# Altium schematic symbol library LATTICEPLDS_Library.SchLib: 291 symbols (part 27 of 32)
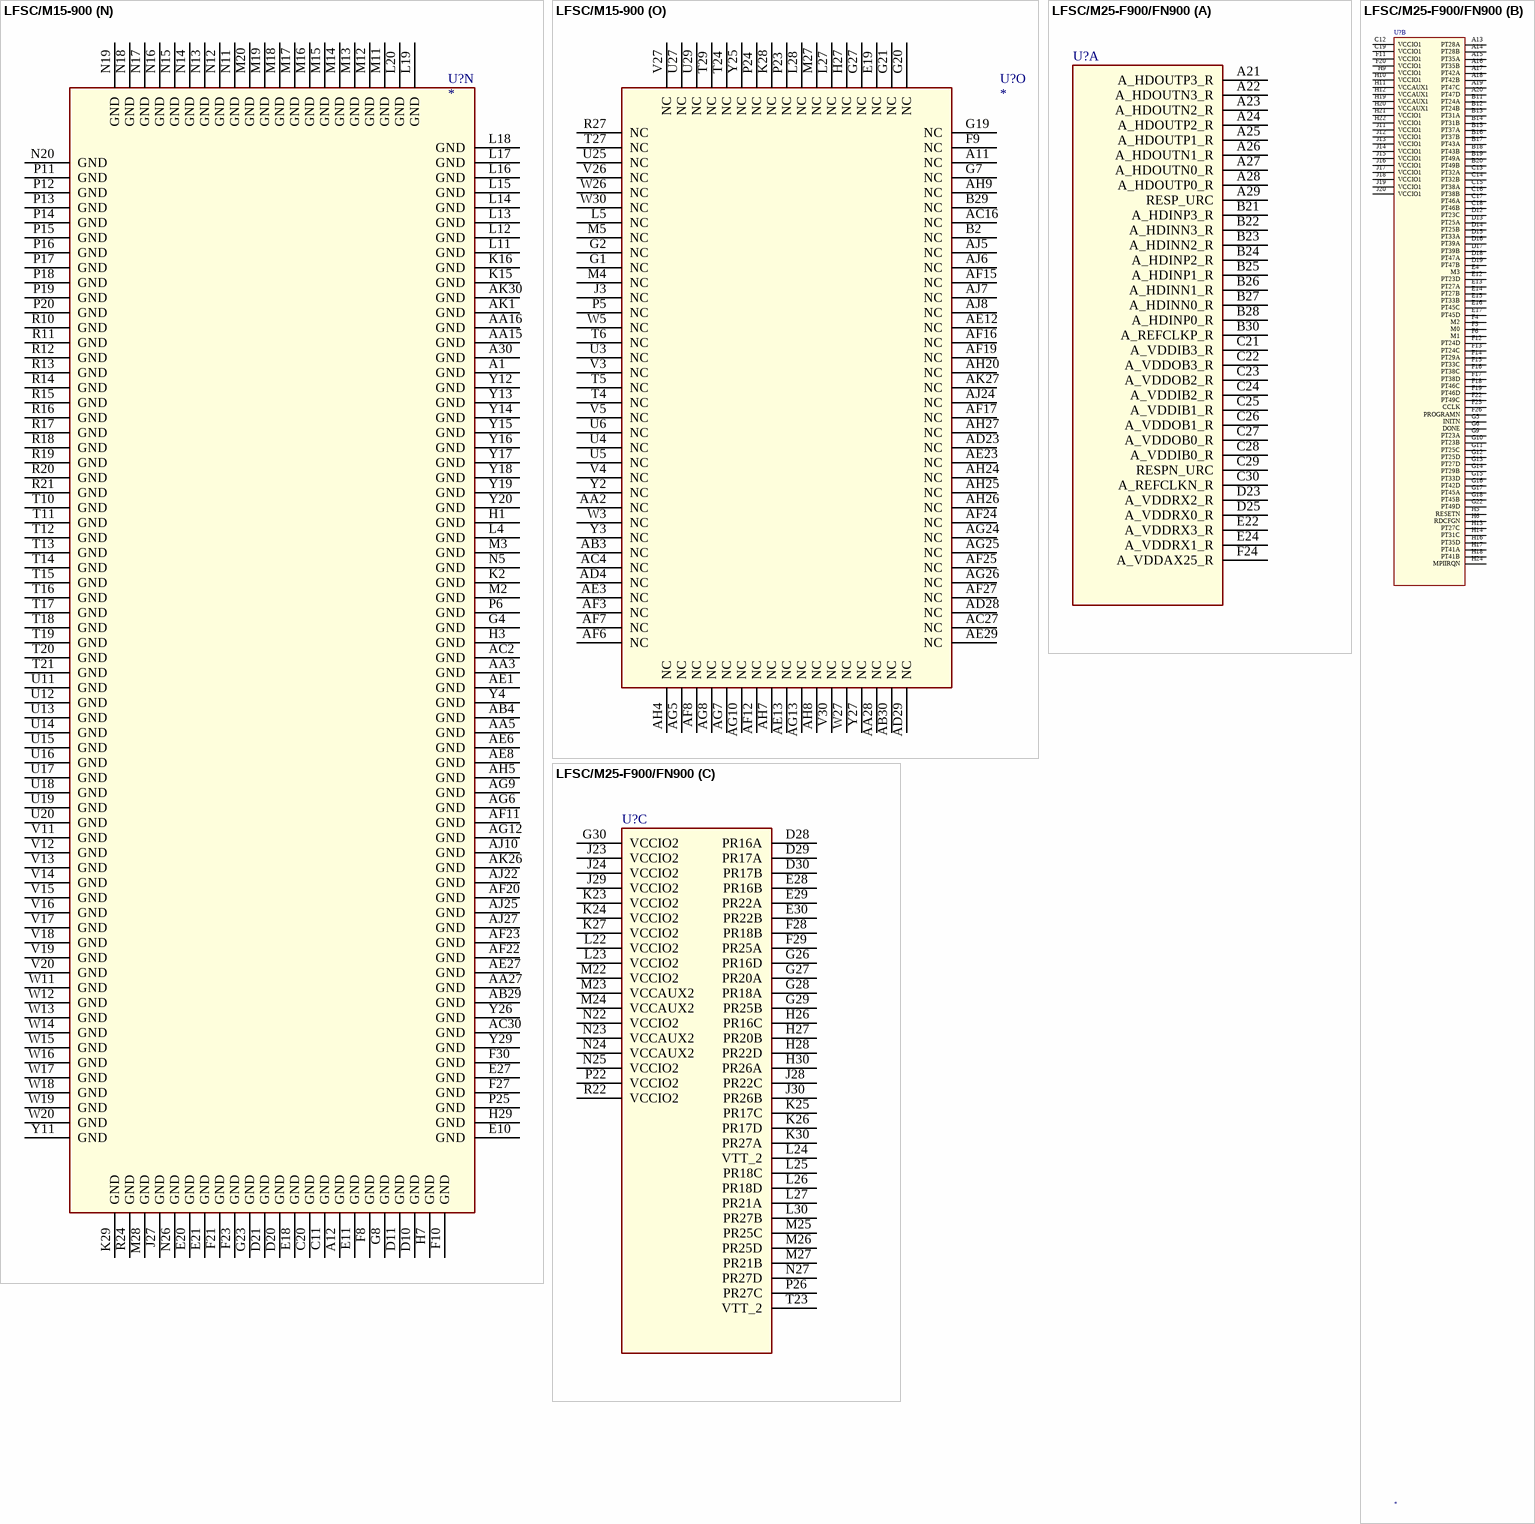
[diagram p329: symbols LFSC/M15-900 to LFSC/M25-F900/FN900]

## LFSC/M15-900
designator U?
SWAP_INFO: (S1+S2+S3+S4+S5+S6+S7+S8+S9+S10+S11+S12+S13+S14+S15); SPLIT_INST: TRUE
part A pins: A3 A_HDOUTP0_L /PCS 360 CH 0 OUT P (out), A4 A_HDOUTN0_L /PCS 360 CH 0 OUT N (out), A5 A_HDOUTN1_L /PCS 360 CH 1 OUT N (out), A6 A_HDOUTP1_L /PCS 360 CH 1 OUT (out), A7 A_HDOUTP2_L /PCS 360 CH 2 OUT P (out), A8 A_HDOUTN2_L /PCS 360 CH 2 OUT N (out), A9 A_HDOUTN3_L /PCS 360 CH 3 OUT N (out), A10 A_HDOUTP3_L /PCS 360 CH 3 OUT (out), A21 A_HDOUTP3_R /PCS 3E0 CH 3 OUT P (out), A22 A_HDOUTN3_R /PCS 3E0 CH 3 OUT N (out), A23 A_HDOUTN2_R /PCS 3E0 CH 2 OUT N (out), A24 A_HDOUTP2_R /PCS 3E0 CH 2 OUT P (out), A25 A_HDOUTP1_R /PCS 3E0 CH 1 OUT P (out), A26 A_HDOUTN1_R /PCS 3E0 CH 1 OUT N (out), A27 A_HDOUTN0_R /PCS 3E0 CH 0 OUT (out), A28 A_HDOUTP0_R /PCS 3E0 CH 0 OUT P (out), B1 A_REFCLKP_L (in), B3 A_HDINP0_L /PCS 360 CH 0 IN P (in), B4 A_HDINN0_L /PCS 360 CH 0 IN N (in), B5 A_HDINN1_L /PCS 360 CH 1 IN N (in), B6 A_HDINP1_L /PCS 360 CH 1 IN P (in), B7 A_HDINP2_L /PCS 360 CH 2 IN P (in), B8 A_HDINN2_L /PCS 360 CH 2 IN N (in), B9 A_HDINN3_L /PCS 360 CH 3 IN N (in), B10 A_HDINP3_L /PCS 360 CH 3 IN P (in), B21 A_HDINP3_R /PCS 3E0 CH 3 IN P (in), B22 A_HDINN3_R /PCS 3E0 CH 3 IN N (in), B23 A_HDINN2_R /PCS 3E0 CH 2 IN N (in), B24 A_HDINP2_R /PCS 3E0 CH 2 IN P (in), B25 A_HDINP1_R /PCS 3E0 CH 1 IN P (in), B26 A_HDINN1_R /PCS 3E0 CH 1 IN N (in), B27 A_HDINN0_R /PCS 3E0 CH 0 IN N (in), B28 A_HDINP0_R /PCS 3E0 CH 0 IN P (in), B30 A_REFCLKP_R (in), C1 A_REFCLKN_L (in), C30 A_REFCLKN_R (in)
part B pins: C3 A_VDDIB0_L (power), C4 A_VDDOB0_L (power), C5 A_VDDOB1_L (power), C6 A_VDDIB1_L (power), C7 A_VDDIB2_L (power), C8 A_VDDOB2_L (power), C9 A_VDDOB3_L (power), C10 A_VDDIB3_L (power), C21 A_VDDIB3_R (power), C22 A_VDDOB3_R (power), C23 A_VDDOB2_R (power), C24 A_VDDIB2_R (power), C25 A_VDDIB1_R (power), C26 A_VDDOB1_R (power), C27 A_VDDOB0_R (power), C28 A_VDDIB0_R (power), F7 A_VDDAX25_L (power), F24 A_VDDAX25_R (power)
part C pins: A13 PT19A /A12/MPI_ADDR26 (io), A14 PT19B /A11/MPI_ADDR25 (io), A15 PT25A /A0/MPI_ADDR14 (io), A16 PT25B /MPI_RETRY (io), A17 PT32A /MCA_DONE_IN (io), A18 PT32B /DOUT (io), A19 PT40C /D10/MPI_DATA10 (io), A20 PT40D /D9/MPI_DATA9 (io), B11 PT11A /MPI_TEA (io), B12 PT11B /A18/MPI_TSIZ0 (io), B13 PT21A /A8/MPI_ADDR22 (io), B14 PT21B /A7/MPI_ADDR21 (io), B15 PT27A /PCLKT1_0/MPI_CLK (io), B16 PT27B /PCLKC1_0 (io), B17 PT33A /QOUT/CEON (io), B18 PT33B /D0/MPI_DATA0 (io), B19 PT41A /CS1/MPI_CS1 (io), B20 PT41B /D8/MPI_DATA8 (io), C13 PT23A /A6/MPI_ADDR20 (io), C14 PT23B /A5/MPI_ADDR19 (io), C15 PT28A /MPI_TA (io), C16 PT28B /DP0/MPI_PAR0 (io), C17 PT37A /D5/MPI_DATA5 (io), C18 PT37B /D6/MPI_DATA6 (io), D12 PT10C /DP1/MPI_PAR1 (io), D13 PT15A /A17/MPI_ADDR31 (io), D14 PT15B /A15/MPI_ADDR29 (io), D15 PT24A /A4/MPI_ADDR18 (io), D16 PT29A /MCA_CLK_P2_IN (io), D17 PT29B /MCA_CLK_P2_OUT (io), D18 PT39A /RDN/MPI_STRB_N (io), D19 PT39B /CS0N/MPI_CS0N (io), E12 PT10D /D14/MPI_DATA14 (io), E13 PT17A /A14/MPI_ADDR28 (io), E14 PT17B /A13/MPI_ADDR27 (io), E15 PT24B /A3/MPI_ADDR17 (io), E16 PT36C /D3/MPI_DATA3 (io), E17 PT36D /D4/MPI_DATA4 (io), F12 PT13D /A19/MPI_TSIZ1 (io), F13 PT13C /A20/MPI_BDIP (io), F14 PT20A /A10/MPI_ADDR24 (io), F15 PT24C /A2/MPI_ADDR16 (io), F16 PT28C /BUSYN/RCLK/SCK (io), F17 PT28D /MCA_DONE_OUT (io), F18 PT37C /D7/MPI_DATA7 (io), F19 PT37D /WRN/MPI_WR_N (io), F22 PT43C /LDCN/SCS (io), G9 PT9A /D15/MPI_DATA15 (io), G10 PT9B /A21/MPI_BURST (io), G11 PT15C /D13/MPI_DATA13 (io), G12 PT15D /A16/MPI_ADDR30 (io), G13 PT17D /D11/MPI_DATA11 (io), G14 PT20B /A9/MPI_ADDR23 (io), G15 PT24D /A1/MPI_ADDR15 (io), G16 PT32D /VREF2_1 (io), G17 PT35A /D1/MPI_DATA1 (io), G18 PT35B /D2/MPI_DATA2 (io), G22 PT43D /HDC/SI (io), H13 PT17C /D12/MPI_DATA12 (io), H14 PT21C /VREF1_1 (io), H16 PT25D /DP3/PCLKC1_4/MPI_PAR3 (io), H17 PT31A /MCA_CLK_P1_IN (io), H18 PT31B /MCA_CLK_P1_OUT (io), H24 MPI_IRQ_N /CFGIRQN/MPI_IRQ_ (out)
part D pins: AA25 PR40A (io), AA30 PR39B (io), AB25 PR40B (io), AB26 PR44C /LRC_DLLT_IN_E/LRC_DLLT_FB_F (io), AB27 PR41D /VREF2_3 (io), AB28 PR43A (io), AC25 PR45D /LRC_PLLC_IN_B/LRC_PLLC_FB_A (io), AC26 PR44D /LRC_DLLC_IN_E/LRC_DLLC_FB_F (io), AC28 PR43B (io), AD26 PR45C /LRC_PLLT_IN_B/LRC_PLLT_FB_A (io), AD30 PR41A (io), AE30 PR41B (io), AF28 PR45B /LRC_DLLC_IN_F/LRC_DLLC_FB_E (io), AF29 PR45A /LRC_DLLT_IN_F/LRC_DLLT_FB_E (io), AF30 PR44A (io), AG30 PR44B (io), D28 PR15A /URC_PLLT_IN_A/URC_PLLT_FB_B (io), D29 PR17A /URC_DLLT_IN_C/URC_DLLT_FB_D (io), D30 PR17B /URC_DLLC_IN_C/URC_DLLC_FB_D (io), E28 PR15B /URC_PLLC_IN_A/URC_PLLC_FB_B (io), E29 PR19A (io), E30 PR19B (io), F28 PR18B /URC_DLLC_IN_D/URC_DLLC_FB_C (io), F29 PR22A (io), G26 PR15D (io), G28 PR18A /URC_DLLT_IN_D/URC_DLLT_FB_C (io), G29 PR22B (io), H26 PR15C (io), H28 PR19D (io), H30 PR23A /PCLKT2_1 (io), J28 PR19C (io), J30 PR23B /PCLKC2_1 (io), K25 PR17C /URC_PLLT_IN_B/URC_PLLT_FB_A (io), K26 PR17D /URC_PLLC_IN_B/URC_PLLC_FB_A (io), K30 PR24A /PCLKT2_0 (io), L25 PR18C (io), L26 PR18D /VREF2_2 (io), L29 PR28C /PCLKT3_2 (io), L30 PR24B /PCLKC2_0 (io), M25 PR22C /VREF1_2 (io), M26 PR22D /DIFFR_2 (io), M29 PR32A (io), M30 PR28D /PCLKC3_2 (io), N27 PR24D /PCLKC2_2 (io), N28 PR27A (io), N29 PR27B (io), N30 PR32B (io), P26 PR24C /PCLKT2_2 (io), P27 PR27C /PCLKT3_3 (io), P28 PR26A /PCLKT3_0 (io), P29 PR28A (io), P30 PR33A (io), R25 PR26D /PCLKC3_1 (io), R26 PR26C /PCLKT3_1 (io), R28 PR26B /PCLKC3_0 (io), R29 PR28B (io), R30 PR33B (io), T26 PR31C /VREF1_3 (io), T28 PR31A (io), T30 PR36A (io), U26 PR31D (io), U28 PR31B (io), U30 PR36B (io), V25 PR35D /DIFFR_3 (io), V28 PR35A (io), V29 PR37A (io), W28 PR35B (io), W29 PR37B (io), Y30 PR39A (io)
part E pins: AD25 PB48D (io), AE16 PB28C (io), AE19 PB40C /PCLKT4_4 (io), AE20 PB40D /PCLKC4_4 (io), AE21 PB41A (io), AE22 PB45C (io), AE24 PB47C /VREF1_4 (io), AE25 PB47D (io), AE26 PB48C (io), AF18 PB36A /PCLKT4_1 (io), AF21 PB41B (io), AG16 PB29B (io), AG17 PB32D (io), AG18 PB36B /PCLKC4_1 (io), AG19 PB37C /VREF2_4 (io), AG21 PB43A (io), AG22 PB43B (io), AG28 PB49C /LRC_DLLT_IN_D/LRC_DLLT_FB_C (io), AG29 PB49D /LRC_DLLC_IN_D/LRC_DLLC_FB_C (io), AH16 PB29A (io), AH17 PB32A (io), AH18 PB32B (io), AH19 PB39C (io), AH21 PB44C (io), AH22 PB44A (io), AH23 PB44B (io), AH28 PB47B (io), AH29 PB48B /LRC_DLLC_IN_C/LRC_DLLC_FB_D (io), AH30 PB49B /LRC_PLLC_IN_A/LRC_PLLC_FB_B (io), AJ16 PB28A (io), AJ17 PB28B (io), AJ18 PB33A (io), AJ19 PB33B (io), AJ20 PB37A /PCLKT4_0 (io), AJ21 PB37B /PCLKC4_0 (io), AJ28 PB47A (io), AJ29 PB48A /LRC_DLLT_IN_C/LRC_DLLT_FB_D (io), AJ30 PB49A /LRC_PLLT_IN_A/LRC_PLLT_FB_B (io), AK16 PB27A (io), AK17 PB27B (io), AK18 PB31A (io), AK19 PB31B (io), AK20 PB35A /PCLKT4_2 (io), AK21 PB35B /PCLKC4_2 (io), AK22 PB39A /PCLKT4_5 (io), AK23 PB39B /PCLKC4_5 (io), AK24 PB40A /PCLKT4_3 (io), AK25 PB40B /PCLKC4_3 (io), AK28 PB45A (io), AK29 PB45B (io)
part F pins: AD6 PB4C (io), AD7 PB5C (io), AD8 PB5D /VREF1_5 (io), AD15 PB21C (io), AE5 PB3D /LLC_DLLC_IN_C/LLC_DLLC_FB_D (io), AE10 PB7D (io), AE11 PB9A (io), AE14 PB12D /PCLKC5_4 (io), AE15 PB21D (io), AF4 PB3C /LLC_DLLT_IN_C/LLC_DLLT_FB_D (io), AF9 PB7C (io), AF10 PB9B (io), AF13 PB12C /PCLKT5_4 (io), AF14 PB13C (io), AG3 PB4A /LLC_DLLT_IN_D/LLC_DLLT_FB_C (io), AG14 PB17B /PCLKC5_2 (io), AG15 PB20B (io), AH1 PB3A /LLC_PLLT_IN_A/LLC_PLLT_FB_B (io), AH2 PB4B /LLC_DLLC_IN_D/LLC_DLLC_FB_C (io), AH3 PB7A (io), AH10 PB12A /PCLKT5_3 (io), AH11 PB12B /PCLKC5_3 (io), AH12 PB21A (io), AH13 PB15D /VREF2_5 (io), AH14 PB17A /PCLKT5_2 (io), AH15 PB20A (io), AJ1 PB3B /LLC_PLLC_IN_A/LLC_PLLC_FB_B (io), AJ2 PB5A (io), AJ3 PB7B (io), AJ4 PB8B (io), AJ11 PB15A /PCLKT5_0 (io), AJ12 PB15B /PCLKC5_0 (io), AJ13 PB21B (io), AJ14 PB24A (io), AJ15 PB24B (io), AK2 PB5B (io), AK3 PB8A (io), AK4 PB11A (io), AK5 PB11B (io), AK6 PB13A /PCLKT5_5 (io), AK7 PB13B /PCLKC5_5 (io), AK8 PB16A /PCLKT5_1 (io), AK9 PB16B /PCLKC5_1 (io), AK10 PB19A (io), AK11 PB19B (io), AK12 PB23A (io), AK13 PB23B (io), AK14 PB25A (io), AK15 PB25B (io)
part G pins: AA1 PL37B (io), AB1 PL39A (io), AB5 PL41D /VREF2_6 (io), AB6 PL44C /LLC_DLLT_IN_E/LLC_DLLT_FB_F (io), AC1 PL39B (io), AC3 PL43A (io), AC5 PL44D /LLC_DLLC_IN_E/LLC_DLLC_FB_F (io), AC6 PL45C /LLC_PLLT_IN_B/LLC_PLLT_FB_A (io), AC7 PL45D /LLC_PLLC_IN_B/LLC_PLLC_FB_A (io), AD2 PL41A (io), AD3 PL43B (io), AE2 PL41B (io), AF1 PL44A (io), AF2 PL45A /LLC_DLLT_IN_F/LLC_DLLT_FB_E (io), AG1 PL44B (io), AG2 PL45B /LLC_DLLC_IN_F/LLC_DLLC_FB_E (io), D1 PL19D (io), D2 PL15B /ULC_PLLC_IN_A/ULC_PLLC_FB_B (io), D3 PL15A /ULC_PLLT_IN_A/ULC_PLLT_FB_B (io), E1 PL19C (io), E2 PL17B /ULC_DLLC_IN_C/ULC_DLLC_FB_D (io), E3 PL17A /ULC_DLLT_IN_C/ULC_DLLT_FB_D (io), F1 PL19B (io), F2 PL19A (io), F3 PL18A /ULC_DLLT_IN_D/ULC_DLLT_FB_C (io), G3 PL18B /ULC_DLLC_IN_D/ULC_DLLC_FB_C (io), J1 PL23A /PCLKT7_1 (io), J4 PL17D /ULC_PLLC_IN_B/ULC_PLLC_FB_A (io), J5 PL15D (io), J6 PL15C (io), K1 PL23B /PCLKC7_1 (io), K3 PL22A (io), K4 PL17C /ULC_PLLT_IN_B/ULC_PLLT_FB_A (io), K5 PL18C (io), K6 PL18D /VREF2_7 (io), L1 PL24A /PCLKT7_0 (io), L3 PL22B (io), L6 PL22C /VREF1_7 (io), M1 PL24B /PCLKC7_0 (io), M6 PL22D /DIFFR_7 (io), N1 PL26B /PCLKC6_0 (io), N2 PL26A /PCLKT6_0 (io), N3 PL27A (io), P1 PL31A (io), P2 PL28A (io), P3 PL27B (io), P4 PL27C /PCLKT6_3 (io), P8 PL24C /PCLKT7_2 (io), R1 PL31B (io), R2 PL28B (io), R3 PL28D /PCLKC6_2 (io), R4 PL31D (io), R5 PL31C /VREF1_6 (io), R6 PL26D /PCLKC6_1 (io), R7 PL26C /PCLKT6_1 (io), R8 PL24D /PCLKC7_2 (io), T1 PL33A (io), T2 PL32A (io), T3 PL28C /PCLKT6_2 (io), U1 PL33B (io), U2 PL32B (io), V1 PL35A (io), V2 PL36A (io), V6 PL35D /DIFFR_6 (io), W1 PL35B (io), W2 PL36B (io), Y1 PL37A (io), Y5 PL40A (io), Y6 PL40B (io)
part H pins: A2 RESP_ULC, A29 RESP_URC, AD5 TEMP, AD27 PROBE_VCC, AE4 XRES, AE28 PROBE_GND, C2 RESPN_ULC, C29 RESPN_URC, E4 M3 (in), F4 M2 (in), F5 M0 (in), F6 M1 (in), F25 CCLK (io), F26 PROGRAMN (in), G5 INITN (io), G6 DONE (io), G24 TDI (in), G25 TCK (in), H5 RESETN (in), H6 TSALLN (in), H25 TDO (out), J25 VCCJ (power), J26 TMS (in)
part I pins: AA9 VCC (power), AA10 VCC (power), AA11 VCC (power), AA12 VCC (power), AA13 VCC (power), AA14 VCC (power), AA17 VCC (power), AA18 VCC (power), AA19 VCC (power), AA20 VCC (power), AA21 VCC (power), AA22 VCC (power), AB10 VCC (power), AB21 VCC (power), J9 VCC (power), J10 VCC (power), J21 VCC (power), J22 VCC (power), K9 VCC (power), K10 VCC (power), K11 VCC (power), K12 VCC (power), K13 VCC (power), K14 VCC (power), K17 VCC (power), K18 VCC (power), K19 VCC (power), K20 VCC (power), K21 VCC (power), K22 VCC (power), L10 VCC (power), L21 VCC (power), M10 VCC (power), M21 VCC (power), N10 VCC (power), N21 VCC (power), P10 VCC (power), P21 VCC (power), U10 VCC (power), U21 VCC (power), V10 VCC (power), V21 VCC (power), W10 VCC (power), W21 VCC (power), Y10 VCC (power), Y21 VCC (power)
part J pins: AB9 VCC12 (power), AB22 VCC12 (power), AC8 VCC12 (power), AC12 VCCAUX (power), AC13 VCCAUX (power), AC14 VCCAUX (power), AC17 VCCAUX (power), AC18 VCCAUX (power), AC19 VCCAUX (power), AC23 VCC12 (power), AD12 VCCAUX (power), AD13 VCCAUX (power), AD14 VCCAUX (power), AD17 VCCAUX (power), AD18 VCCAUX (power), AD19 VCCAUX (power), AF5 VCC12 (power), AF26 VCC12 (power), AG4 VCC12 (power), AG27 VCC12 (power), D4 VCC12 (power), D5 VCC12 (power), D6 VCC12 (power), D7 VCC12 (power), D8 VCC12 (power), D9 VCC12 (power), D22 VCC12 (power), D23 VCC12 (power), D24 VCC12 (power), D25 VCC12 (power), D26 VCC12 (power), D27 VCC12 (power), E5 VCC12 (power), E6 VCC12 (power), E7 VCC12 (power), E8 VCC12 (power), E9 VCC12 (power), E22 VCC12 (power), E23 VCC12 (power), E24 VCC12 (power), E25 VCC12 (power), E26 VCC12 (power), H8 VCC12 (power), H11 VCCAUX (power), H12 VCCAUX (power), H15 VCC12 (power), H19 VCCAUX (power), H20 VCCAUX (power), H23 VCC12 (power), M7 VCCAUX (power), M8 VCCAUX (power), M23 VCCAUX (power), M24 VCCAUX (power), N7 VCCAUX (power), N8 VCCAUX (power), N23 VCCAUX (power), N24 VCCAUX (power), R23 VCC12 (power), T8 VCC12 (power), U7 VCCAUX (power), U8 VCCAUX (power), U23 VCCAUX (power), U24 VCCAUX (power), V7 VCCAUX (power), V8 VCCAUX (power), V23 VCCAUX (power), V24 VCCAUX (power), W7 VCCAUX (power), W8 VCCAUX (power), W23 VCCAUX (power), W24 VCCAUX (power)
part K pins: AB11 VCCIO5 (power), AB12 VCCIO5 (power), AB13 VCCIO5 (power), AB14 VCCIO5 (power), AB15 VCCIO5 (power), AB16 VCCIO4 (power), AB17 VCCIO4 (power), AB18 VCCIO4 (power), AB19 VCCIO4 (power), AB20 VCCIO4 (power), AC9 VCCIO5 (power), AC10 VCCIO5 (power), AC11 VCCIO5 (power), AC20 VCCIO4 (power), AC21 VCCIO4 (power), AC22 VCCIO4 (power), AD9 VCCIO5 (power), AD10 VCCIO5 (power), AD11 VCCIO5 (power), AD20 VCCIO4 (power), AD21 VCCIO4 (power), AD22 VCCIO4 (power), AE7 VCCIO5 (power), AG11 VCCIO5 (power), AG20 VCCIO4 (power), AG23 VCCIO4 (power), AH6 VCCIO5 (power), AJ9 VCCIO5 (power), AJ23 VCCIO4 (power), AJ26 VCCIO4 (power), C12 VCCIO1 (power), C19 VCCIO1 (power), F11 VCCIO1 (power), F20 VCCIO1 (power), H9 VCCIO1 (power), H10 VCCIO1 (power), H21 VCCIO1 (power), H22 VCCIO1 (power), J11 VCCIO1 (power), J12 VCCIO1 (power), J13 VCCIO1 (power), J14 VCCIO1 (power), J15 VCCIO1 (power), J16 VCCIO1 (power), J17 VCCIO1 (power), J18 VCCIO1 (power), J19 VCCIO1 (power), J20 VCCIO1 (power)
part L pins: AA4 VCCIO6 (power), AA7 VCCIO6 (power), AA8 VCCIO6 (power), AA23 VCCIO3 (power), AA24 VCCIO3 (power), AA26 VCCIO3 (power), AA29 VCCIO3 (power), AB2 VCCIO6 (power), AB7 VCCIO6 (power), AB8 VCCIO6 (power), AB23 VCCIO3 (power), AB24 VCCIO3 (power), AC29 VCCIO3 (power), AD1 VCCIO6 (power), G30 VCCIO2 (power), H2 VCCIO7 (power), H4 VCCIO7 (power), J2 VCCIO7 (power), J7 VCCIO7 (power), J8 VCCIO7 (power), J23 VCCIO2 (power), J24 VCCIO2 (power), J29 VCCIO2 (power), K7 VCCIO7 (power), K8 VCCIO7 (power), K23 VCCIO2 (power), K24 VCCIO2 (power), K27 VCCIO2 (power), L2 VCCIO7 (power), L8 VCCIO7 (power), L9 VCCIO7 (power), L22 VCCIO2 (power), L23 VCCIO2 (power), M9 VCCIO7 (power), M22 VCCIO2 (power), N4 VCCIO7 (power), N6 VCCIO7 (power), N9 VCCIO7 (power), N22 VCCIO2 (power), N25 VCCIO2 (power), P9 VCCIO7 (power), P22 VCCIO2 (power), R9 VCCIO7 (power), R22 VCCIO2 (power), T9 VCCIO6 (power), T22 VCCIO3 (power), U9 VCCIO6 (power), U22 VCCIO3 (power), V9 VCCIO6 (power), V22 VCCIO3 (power), W4 VCCIO6 (power), W9 VCCIO6 (power), W22 VCCIO3 (power), Y7 VCCIO6 (power), Y8 VCCIO6 (power), Y9 VCCIO6 (power), Y22 VCCIO3 (power), Y23 VCCIO3 (power), Y24 VCCIO3 (power), Y28 VCCIO3 (power)
part M pins: AA6 VTT_6, AC15 VTT_5, AC24 VTT_3, AD16 VTT_5, AD24 VTT_4, AE9 VTT_5, AE17 VTT_4, AE18 VTT_4, L7 VTT_7, L24 VTT_2, P7 VTT_7, T7 VTT_6, T23 VTT_2, T25 VTT_3, W6 VTT_6, W25 VTT_3
part N pins: A1 GND (power), A12 GND (power), A30 GND (power), AA3 GND (power), AA5 GND (power), AA15 GND (power), AA16 GND (power), AA27 GND (power), AB4 GND (power), AB29 GND (power), AC2 GND (power), AC30 GND (power), AE1 GND (power), AE6 GND (power), AE8 GND (power), AE27 GND (power), AF11 GND (power), AF20 GND (power), AF22 GND (power), AF23 GND (power), AG6 GND (power), AG9 GND (power), AG12 GND (power), AH5 GND (power), AJ10 GND (power), AJ22 GND (power), AJ25 GND (power), AJ27 GND (power), AK1 GND (power), AK26 GND (power), AK30 GND (power), C11 GND (power), C20 GND (power), D10 GND (power), D11 GND (power), D20 GND (power), D21 GND (power), E10 GND (power), E11 GND (power), E18 GND (power), E20 GND (power), E21 GND (power), E27 GND (power), F8 GND (power), F10 GND (power), F21 GND (power), F23 GND (power), F27 GND (power), F30 GND (power), G4 GND (power), G8 GND (power), G23 GND (power), H1 GND (power), H3 GND (power), H7 GND (power), H29 GND (power), J27 GND (power), K2 GND (power), K15 GND (power), K16 GND (power), K29 GND (power), L4 GND (power), L11 GND (power), L12 GND (power), L13 GND (power), L14 GND (power), L15 GND (power), L16 GND (power), L17 GND (power), L18 GND (power), L19 GND (power), L20 GND (power), M2 GND (power), M3 GND (power), M11 GND (power), M12 GND (power), M13 GND (power), M14 GND (power), M15 GND (power), M16 GND (power), M17 GND (power), M18 GND (power), M19 GND (power), M20 GND (power), M28 GND (power), N5 GND (power), N11 GND (power), N12 GND (power), N13 GND (power), N14 GND (power), N15 GND (power), N16 GND (power), N17 GND (power), N18 GND (power), N19 GND (power), N20 GND (power), N26 GND (power), P6 GND (power), P11 GND (power), P12 GND (power), P13 GND (power), P14 GND (power), P15 GND (power), P16 GND (power), P17 GND (power), P18 GND (power), P19 GND (power), P20 GND (power), P25 GND (power), R10 GND (power), R11 GND (power), R12 GND (power), R13 GND (power), R14 GND (power), R15 GND (power), R16 GND (power), R17 GND (power), R18 GND (power), R19 GND (power), R20 GND (power), R21 GND (power), R24 GND (power), T10 GND (power), T11 GND (power), T12 GND (power), T13 GND (power), T14 GND (power), T15 GND (power), T16 GND (power), T17 GND (power), T18 GND (power), T19 GND (power), T20 GND (power), T21 GND (power), U11 GND (power), U12 GND (power), U13 GND (power), U14 GND (power), U15 GND (power), U16 GND (power), U17 GND (power), U18 GND (power), U19 GND (power), U20 GND (power), V11 GND (power), V12 GND (power), V13 GND (power), V14 GND (power), V15 GND (power), V16 GND (power), V17 GND (power), V18 GND (power), V19 GND (power), V20 GND (power), W11 GND (power), W12 GND (power), W13 GND (power), W14 GND (power), W15 GND (power), W16 GND (power), W17 GND (power), W18 GND (power), W19 GND (power), W20 GND (power), Y4 GND (power), Y11 GND (power), Y12 GND (power), Y13 GND (power), Y14 GND (power), Y15 GND (power), Y16 GND (power), Y17 GND (power), Y18 GND (power), Y19 GND (power), Y20 GND (power), Y26 GND (power), Y29 GND (power)
part O pins: A11 NC, AA2 NC, AA28 NC, AB3 NC, AB30 NC, AC4 NC, AC16 NC, AC27 NC, AD4 NC, AD23 NC, AD28 NC, AD29 NC, AE3 NC, AE12 NC, AE13 NC, AE23 NC, AE29 NC, AF3 NC, AF6 NC, AF7 NC, AF8 NC, AF12 NC, AF15 NC, AF16 NC, AF17 NC, AF19 NC, AF24 NC, AF25 NC, AF27 NC, AG5 NC, AG7 NC, AG8 NC, AG10 NC, AG13 NC, AG24 NC, AG25 NC, AG26 NC, AH4 NC, AH7 NC, AH8 NC, AH9 NC, AH20 NC, AH24 NC, AH25 NC, AH26 NC, AH27 NC, AJ5 NC, AJ6 NC, AJ7 NC, AJ8 NC, AJ24 NC, AK27 NC, B2 NC, B29 NC, E19 NC, F9 NC, G1 NC, G2 NC, G7 NC, G19 NC, G20 NC, G21 NC, G27 NC, H27 NC, J3 NC, K28 NC, L5 NC, L27 NC, L28 NC, M4 NC, M5 NC, M27 NC, P5 NC, P23 NC, P24 NC, R27 NC, T4 NC, T5 NC, T6 NC, T24 NC, T27 NC, T29 NC, U3 NC, U4 NC, U5 NC, U6 NC, U25 NC, U27 NC, U29 NC, V3 NC, V4 NC, V5 NC, V26 NC, V27 NC, V30 NC, W3 NC, W5 NC, W26 NC, W27 NC, W30 NC, Y2 NC, Y3 NC, Y25 NC, Y27 NC
part A text: SERDES
part B text: SERDES; Supplies
part C text: BANK 1
part D text: BANK 2; BANK 3
part E text: BANK 4
part F text: BANK 5
part G text: BANK 7; BANK 8
part H text: Program; Misc
part I text: VCC_Core
part K text: VCCIO; 1.2 to 3.3V
part L text: VCCIO; 1.2 to 2.5V

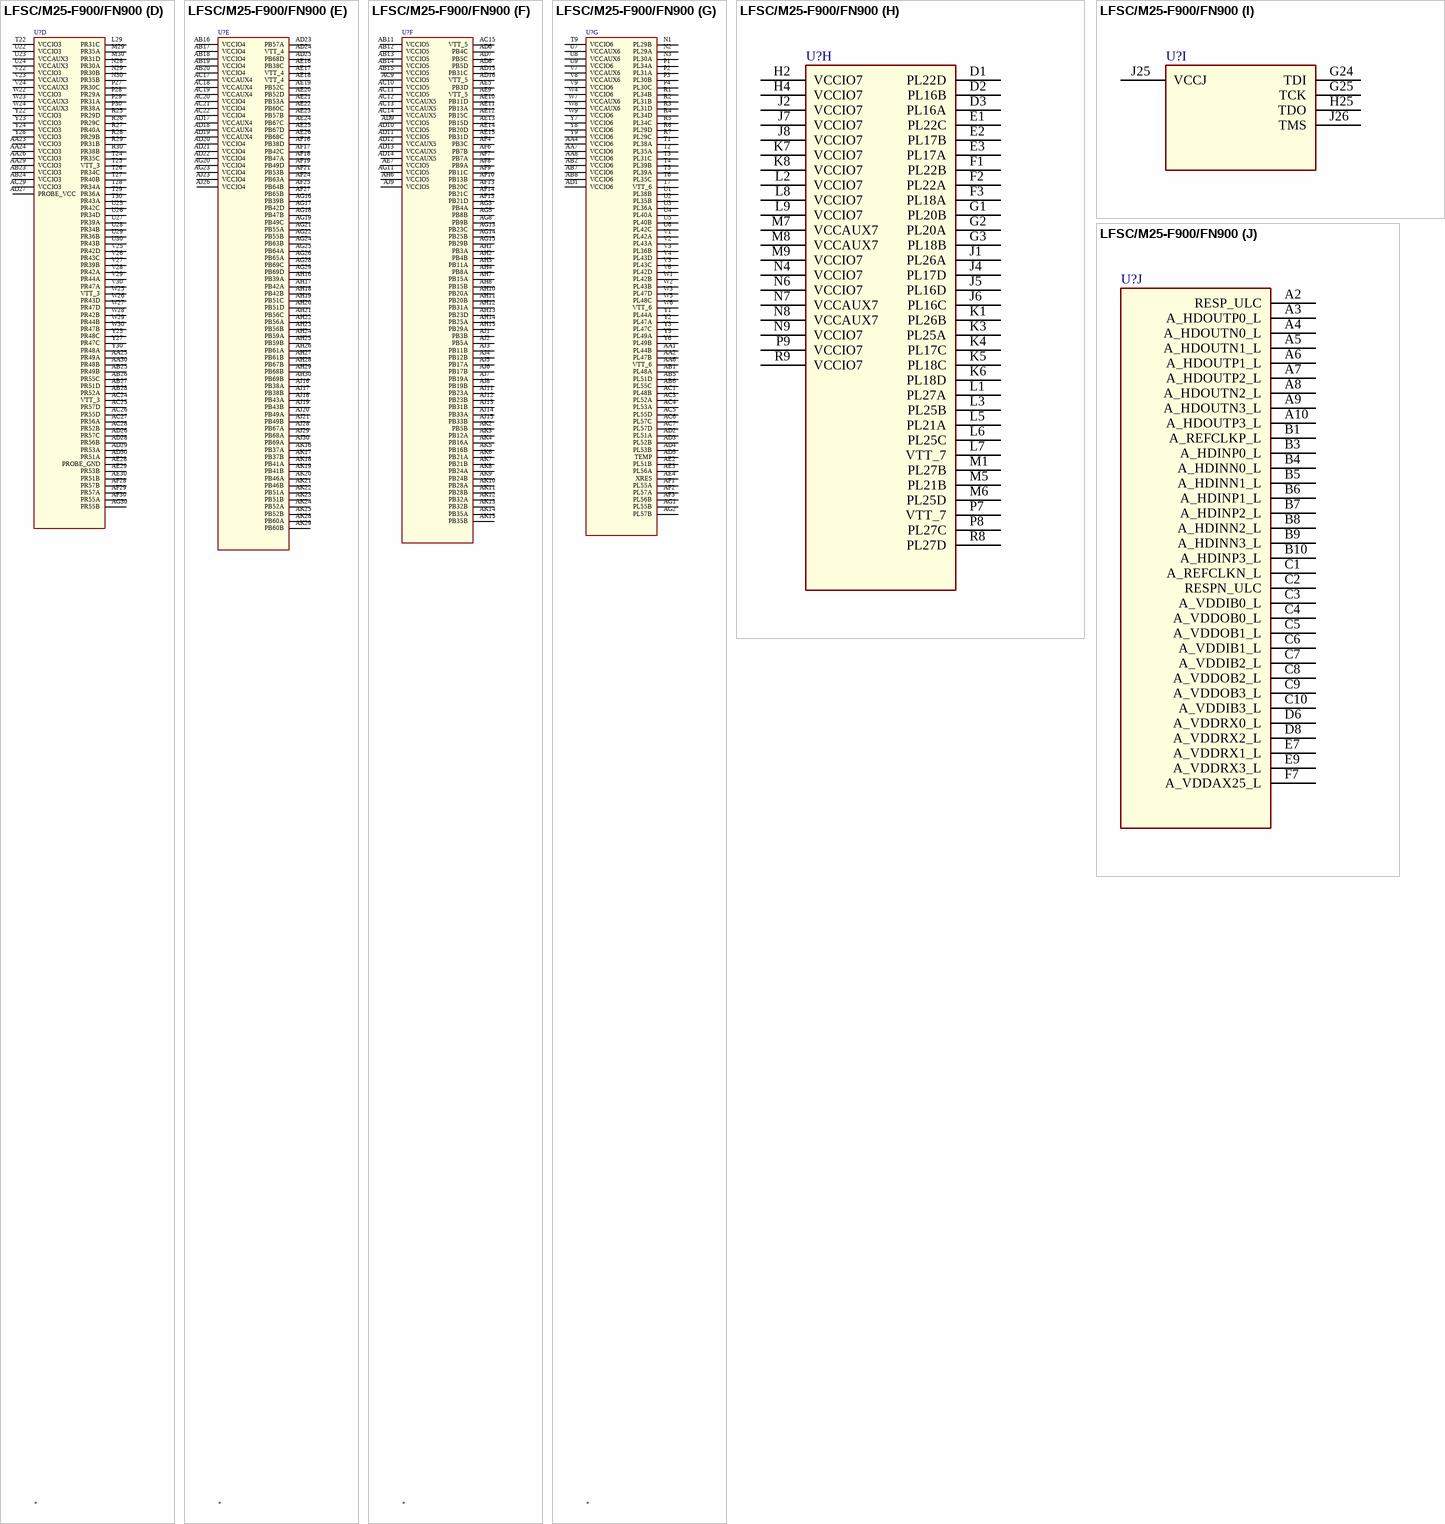
[diagram p246: symbol LFSC/M25-F900/FN900]

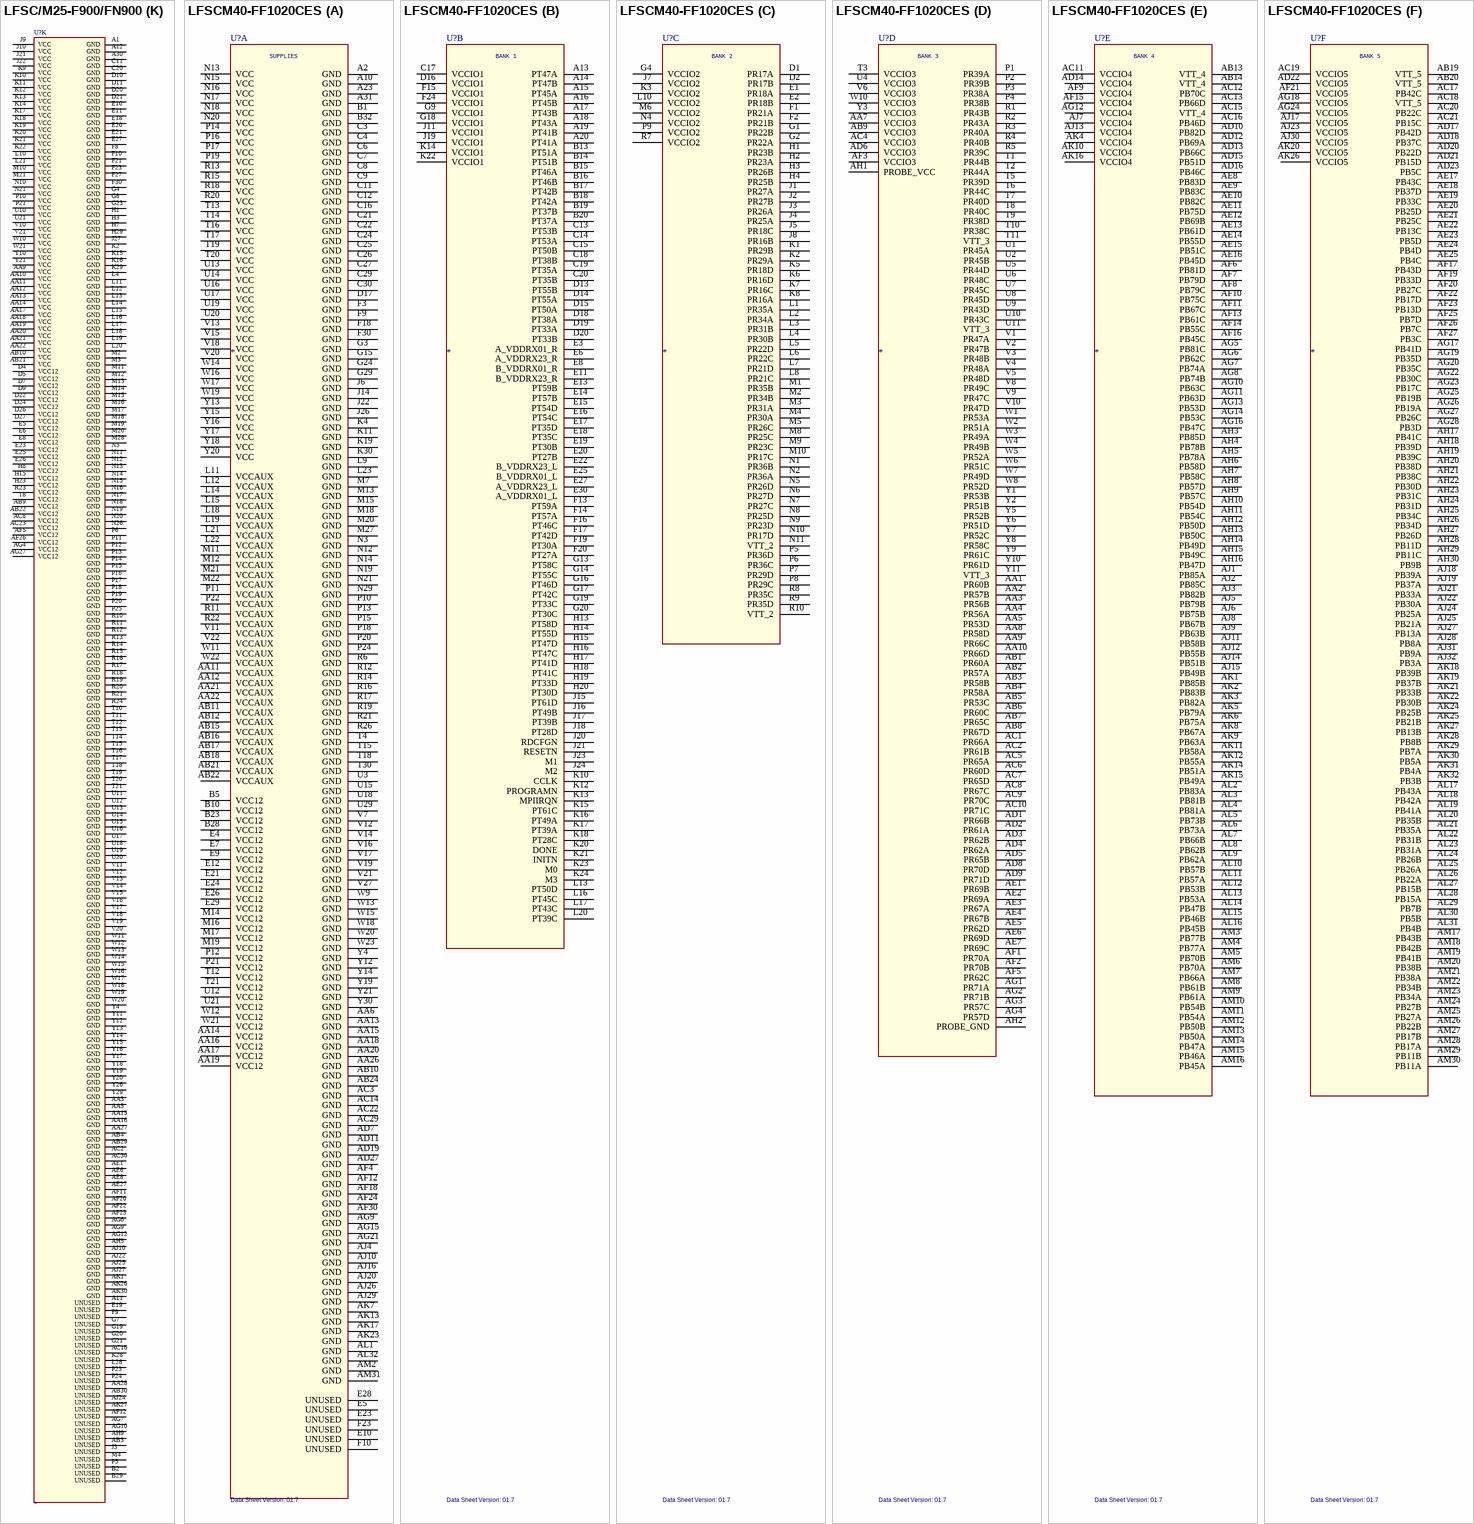
[diagram p247: symbols LFSC/M25-F900/FN900 to LFSCM40-FF1020CES]

## LFSC/M25-F900/FN900
designator U?
SPLIT_INST: TRUE; SWAP_INFO: (S1+S2+S3+S4+S5+S6+S7+S8+S9+S10+S11)
part A pins: A21 A_HDOUTP3_R, A22 A_HDOUTN3_R, A23 A_HDOUTN2_R, A24 A_HDOUTP2_R, A25 A_HDOUTP1_R, A26 A_HDOUTN1_R, A27 A_HDOUTN0_R, A28 A_HDOUTP0_R, A29 RESP_URC, B21 A_HDINP3_R, B22 A_HDINN3_R, B23 A_HDINN2_R, B24 A_HDINP2_R, B25 A_HDINP1_R, B26 A_HDINN1_R, B27 A_HDINN0_R, B28 A_HDINP0_R, B30 A_REFCLKP_R, C21 A_VDDIB3_R, C22 A_VDDOB3_R, C23 A_VDDOB2_R, C24 A_VDDIB2_R, C25 A_VDDIB1_R, C26 A_VDDOB1_R, C27 A_VDDOB0_R, C28 A_VDDIB0_R, C29 RESPN_URC, C30 A_REFCLKN_R, D23 A_VDDRX2_R, D25 A_VDDRX0_R, E22 A_VDDRX3_R, E24 A_VDDRX1_R, F24 A_VDDAX25_R
part B pins: A13 PT28A, A14 PT28B, A15 PT35A, A16 PT35B, A17 PT42A, A18 PT42B, A19 PT47C, A20 PT47D, B11 PT24A, B12 PT24B, B13 PT31A, B14 PT31B, B15 PT37A, B16 PT37B, B17 PT43A, B18 PT43B, B19 PT49A, B20 PT49B, C12 VCCIO1 (power), C13 PT32A, C14 PT32B, C15 PT38A, C16 PT38B, C17 PT46A, C18 PT46B, C19 VCCIO1 (power), D12 PT23C, D13 PT25A, D14 PT25B, D15 PT33A, D16 PT39A, D17 PT39B, D18 PT47A, D19 PT47B, E4 M3, E12 PT23D, E13 PT27A, E14 PT27B, E15 PT33B, E16 PT45C, E17 PT45D, F4 M2, F5 M0, F6 M1, F11 VCCIO1 (power), F12 PT24D, F13 PT24C, F14 PT29A, F15 PT33C, F16 PT38C, F17 PT38D, F18 PT46C, F19 PT46D, F20 VCCIO1 (power), F22 PT49C, F25 CCLK, F26 PROGRAMN, G5 INITN, G6 DONE, G9 PT23A, G10 PT23B, G11 PT25C, G12 PT25D, G13 PT27D, G14 PT29B, G15 PT33D, G16 PT42D, G17 PT45A, G18 PT45B, G22 PT49D, H5 RESETN, H6 RDCFGN, H9 VCCIO1 (power), H10 VCCIO1 (power), H11 VCCAUX1 (power), H12 VCCAUX1 (power), H13 PT27C, H14 PT31C, H16 PT35D, H17 PT41A, H18 PT41B, H19 VCCAUX1 (power), H20 VCCAUX1 (power), H21 VCCIO1 (power), H22 VCCIO1 (power), H24 MPIIRQN, J11 VCCIO1 (power), J12 VCCIO1 (power), J13 VCCIO1 (power), J14 VCCIO1 (power), J15 VCCIO1 (power), J16 VCCIO1 (power), J17 VCCIO1 (power), J18 VCCIO1 (power), J19 VCCIO1 (power), J20 VCCIO1 (power)
part C pins: D28 PR16A, D29 PR17A, D30 PR17B, E28 PR16B, E29 PR22A, E30 PR22B, F28 PR18B, F29 PR25A, G26 PR16D, G27 PR20A, G28 PR18A, G29 PR25B, G30 VCCIO2 (power), H26 PR16C, H27 PR20B, H28 PR22D, H30 PR26A, J23 VCCIO2 (power), J24 VCCIO2 (power), J28 PR22C, J29 VCCIO2 (power), J30 PR26B, K23 VCCIO2 (power), K24 VCCIO2 (power), K25 PR17C, K26 PR17D, K27 VCCIO2 (power), K30 PR27A, L22 VCCIO2 (power), L23 VCCIO2 (power), L24 VTT_2, L25 PR18C, L26 PR18D, L27 PR21A, L30 PR27B, M22 VCCIO2 (power), M23 VCCAUX2 (power), M24 VCCAUX2 (power), M25 PR25C, M26 PR25D, M27 PR21B, N22 VCCIO2 (power), N23 VCCAUX2 (power), N24 VCCAUX2 (power), N25 VCCIO2 (power), N27 PR27D, P22 VCCIO2 (power), P26 PR27C, R22 VCCIO2 (power), T23 VTT_2
part D pins: AA23 VCCIO3 (power), AA24 VCCIO3 (power), AA25 PR49A, AA26 VCCIO3 (power), AA29 VCCIO3 (power), AA30 PR48B, AB23 VCCIO3 (power), AB24 VCCIO3 (power), AB25 PR49B, AB26 PR55C, AB27 PR51D, AB28 PR52A, AC24 VTT_3, AC25 PR57D, AC26 PR55D, AC27 PR56A, AC28 PR52B, AC29 VCCIO3 (power), AD26 PR57C, AD27 PROBE_VCC (power), AD28 PR56B, AD29 PR53A, AD30 PR51A, AE28 PROBE_GND (power), AE29 PR53B, AE30 PR51B, AF28 PR57B, AF29 PR57A, AF30 PR55A, AG30 PR55B, L29 PR31C, M29 PR35A, M30 PR31D, N28 PR30A, N29 PR30B, N30 PR35B, P27 PR30C, P28 PR29A, P29 PR31A, P30 PR38A, R25 PR29D, R26 PR29C, R27 PR40A, R28 PR29B, R29 PR31B, R30 PR38B, T22 VCCIO3 (power), T24 PR35C, T25 VTT_3, T26 PR34C, T27 PR40B, T28 PR34A, T29 PR36A, T30 PR43A, U22 VCCIO3 (power), U23 VCCAUX3 (power), U24 VCCAUX3 (power), U25 PR42C, U26 PR34D, U27 PR39A, U28 PR34B, U29 PR36B, U30 PR43B, V22 VCCIO3 (power), V23 VCCAUX3 (power), V24 VCCAUX3 (power), V25 PR42D, V26 PR43C, V27 PR39B, V28 PR42A, V29 PR44A, V30 PR47A, W22 VCCIO3 (power), W23 VCCAUX3 (power), W24 VCCAUX3 (power), W25 VTT_3, W26 PR43D, W27 PR47D, W28 PR42B, W29 PR44B, W30 PR47B, Y22 VCCIO3 (power), Y23 VCCIO3 (power), Y24 VCCIO3 (power), Y25 PR48C, Y27 PR47C, Y28 VCCIO3 (power), Y30 PR48A